# Altium integrated library esd_library.IntLib: 968 symbols (part 1 of 6)
Pins are listed as number, name and electrical type; pins without a type are passive.

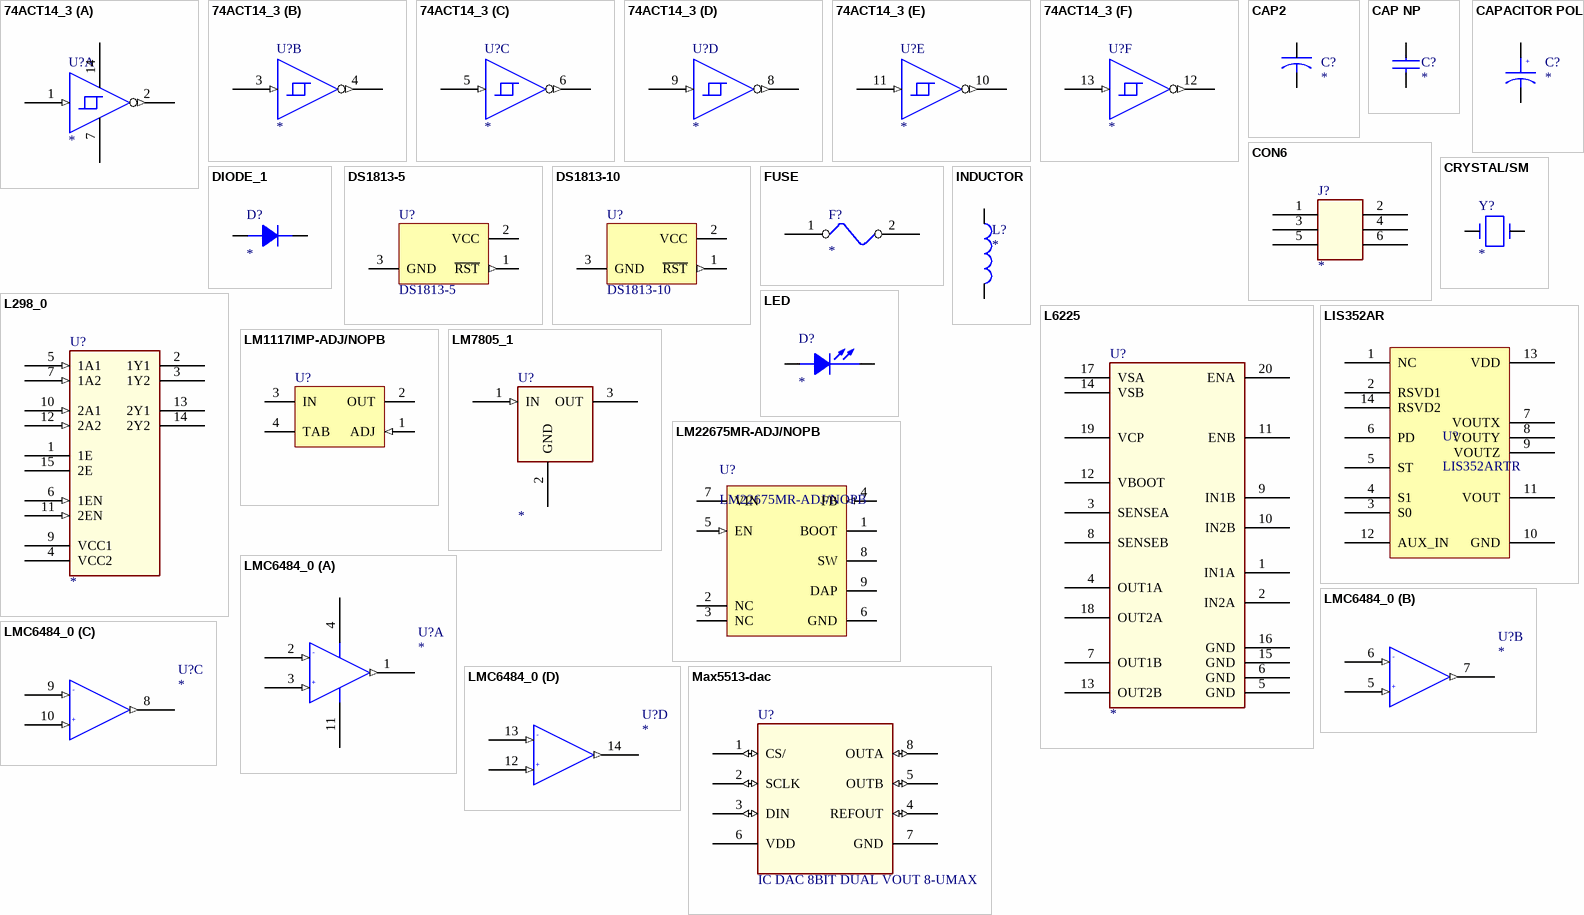
[diagram p0: symbols 74ACT14_3 to Max5513-dac]

## 74ACT14_3
designator U?
IC INVERTER HEX SCHMITT 14SOIC; MPN: 74ACT14SCX; PN: 74ACT14SCXCT-ND; URL: http://www.digikey.ca/product-detail/en/74ACT14SCX/74ACT14SCXCT-ND
footprint SOIC127P600X175-14M (SOIC, 14-Leads, Body 8.65x3.90mm, Pitch 1.27mm, IPC Low Density)
part A pins: 1 A (in), 2 Y (out), 7 GND_POWER (power), 14 VCC (power)
part B pins: 3 A (in), 4 Y (out)
part C pins: 5 A (in), 6 Y (out)
part D pins: 8 Y (out), 9 A (in)
part E pins: 10 Y (out), 11 A (in)
part F pins: 12 Y (out), 13 A (in)

## CAP2
designator C?
pins: 1, 2

## CAP NP
designator C?
pins: 1, 2

## CAPACITOR POL
designator C?
pins: 1, 2
text: +

## CON6
designator J?
CONN HEADER BRKWAY 6POS DL .100; MPN: 5-146254-3; PN: A105155-ND; URL: http://www.digikey.ca/product-detail/en/5-146254-3/A105155-ND
footprint HDR3X2 (Connector; Header Male; 3x2 Position)
pins: 1, 2, 3, 4, 5, 6

## CRYSTAL/SM
designator Y?
pins: 1, 2

## DIODE_1
designator D?
pins: 1 A, 2 C

## DS1813-5
designator U?
5V EconoReset with Pushbutton; MPN: DS1813R-5+T&R; PN: DS1813R-5+CT-ND; Published: 13-Oct-2000; LatestRevisionDate: 17-Jul-2002; LatestRevisionNote: Re-released for DXP Platform.; DatasheetVersion: 7-May-1998; PackageVersion: Feb-1999; PackageReference: TO-92; Publisher: Altium Limited; PackageDescription: TO, Flat Index; 3 In-Line, Axial Leads; Body Dia. 4.7mm; Leads 0.56 x 0.51 mm (max); ComponentLink1Description: Manufacturer Link; ComponentLink1URL: http://www.maxim-ic.com/; ComponentLink2Description: Datasheet; ComponentLink2URL: http://pdfserv.maxim-ic.com/en/ds/DS1813.pdf; URL: http://www.digikey.ca/product-detail/en/DS1813R-5%2BT%26R/DS1813R-5%2BCT-ND
footprint SOT95P230X110-3M (SOT23, 3-Leads, Body 2.90x2.30mm, Pitch 0.95mm, IPC Low Density)
pins: 1 ~{RST} (out), 2 VCC (power), 3 GND (power)

## DS1813-10
designator U?
5V EconoReset with Pushbutton; MPN: DS1813R-10+T&R; PN: DS1813R-10+T&RCT-ND; Published: 13-Oct-2000; LatestRevisionDate: 17-Jul-2002; LatestRevisionNote: Re-released for DXP Platform.; DatasheetVersion: 7-May-1998; PackageVersion: Feb-1999; PackageReference: TO-92; Publisher: Altium Limited; PackageDescription: TO, Flat Index; 3 In-Line, Axial Leads; Body Dia. 4.7mm; Leads 0.56 x 0.51 mm (max); ComponentLink1Description: Manufacturer Link; ComponentLink1URL: http://www.maxim-ic.com/; ComponentLink2Description: Datasheet; ComponentLink2URL: http://pdfserv.maxim-ic.com/en/ds/DS1813.pdf; URL: http://www.digikey.ca/product-detail/en/DS1813R-10%2BT%26R/DS1813R-10%2BT%26RCT-ND
footprint SOT95P230X110-3M (SOT23, 3-Leads, Body 2.90x2.30mm, Pitch 0.95mm, IPC Low Density)
pins: 1 ~{RST} (out), 2 VCC (power), 3 GND (power)

## FUSE
designator F?
pins: 1, 2

## INDUCTOR
designator L?
pins: 1, 2

## L298_0
designator U?
IC BRIDGE DRIVER PAR 15MULTIWATT; MPN: L298N; PN: 497-1395-5-ND; URL: http://www.digikey.ca/product-detail/en/L298N/497-1395-5-ND
footprint ZIGZAG.100/L.850/15_VERT
pins: 1 1E, 2 1Y1 (hiz), 3 1Y2 (hiz), 4 VCC2 (power), 5 1A1 (in), 6 1EN (in), 7 1A2 (in), 8 GND_POWER (power) hidden to GND_POWER, 9 VCC1 (power), 10 2A1 (in), 11 2EN (in), 12 2A2 (in), 13 2Y1 (hiz), 14 2Y2 (hiz), 15 2E

## L6225
designator U?
IC MOTOR DRIVER PAR 20POWERSO; MPN: L6225PDTR; PN: 497-5345-1-ND; URL: http://www.digikey.ca/product-detail/en/L6225PDTR/497-5345-1-ND
footprint POWERSOP20
pins: 1 IN1A, 2 IN2A, 3 SENSEA (oc), 4 OUT1A, 5 GND (power), 6 GND (power), 7 OUT1B, 8 SENSEB (power), 9 IN1B, 10 IN2B, 11 ENB, 12 VBOOT (power), 13 OUT2B, 14 VSB (power), 15 GND (power), 16 GND (power), 17 VSA (power), 18 OUT2A, 19 VCP (power), 20 ENA

## LED
designator D?
pins: 1 A, 2 C

## LIS352AR
designator U?, comment LIS352ARTR
IC ACCELEROMETER 3AXIS LP 14LGA; PN: 497-11075-1-ND; MPN: LIS352ARTR; URL: http://www.digikey.ca/product-detail/en/LIS352ARTR/497-11075-1-ND
footprint LGA-14-3X5MM
pins: 1 NC "Internally not connected", 2 RSVD1 "Connect to Vdd", 3 S0 "Mux selector 0 (connect to Vdd or to GND)", 4 S1 "Mux selector 1 (connect to Vdd or to GND)", 5 ST "Self-test (logic 0: normal mode; logic 1: self-test)", 6 PD "Power-down (logic 0: normal mode; logic 1: power-down mode)", 7 VOUTX "Output voltage X channel", 8 VOUTY "Output voltage Y channel", 9 VOUTZ "Output voltage Z channel", 10 GND "0 V supply", 11 VOUT "Multiplexer output", 12 AUX_IN "Auxiliary input", 13 VDD "Power supply", 14 RSVD2 "Connect to Vdd"

## LM1117IMP-ADJ/NOPB
designator U?
800mA Low-Dropout Linear Regulator, 4-pin SOT-223, Pb-Free; PartNumber: LM1117IMP-ADJ/NOPB; Manufacturer: National Semiconductor; MPN: LM1117MP-3.3/NOPB; PackageTopMarking: XYTT*N03B; PowerWise: N; CompType: LDO IC; PN: LM1117MP-3.3/NOPBCT-ND; Published: 1-Mar-2010; DatasheetVersion: Apr-2006; PackageVersion: revB, Apr-2003; PackageReference: MP04A; Publisher: Altium Limited; PackageDescription: Molded SOT-223, 6.50 x 3.56 x 1.6mm Body, 4 Lead, 2.3mm Pitch; Supplier 1: Digi-Key; Supplier Part Number 1: LM1117IMP-ADJTR-ND; Supplier 2: Digi-Key; Supplier Part Number 2: LM1117IMP-ADJCT-ND; Supplier 3: Digi-Key; Supplier Part Number 3: LM1117IMP-ADJDKR-ND; Supplier 4: Farnell; Supplier Part Number 4: 1469050; RoHS: Y; PinCount: 4; Code_JEDEC: TO-261-AA; Code_IPC: SOT223-4; ComponentLink1Description: LM1117 Datasheet; ComponentLink1URL: http://www.national.com/ds/LM/LM1117.pdf; ComponentLink2Description: LM1117 Web Page; ComponentLink2URL: http://www.national.com/pf/LM/LM1117.html; ComponentLink3Description: MP04A Package Page; ComponentLink3URL: http://www.national.com/packaging/folders/mp04a.html; URL: http://www.digikey.ca/product-detail/en/LM1117MP-3.3%2FNOPB/LM1117MP-3.3%2FNOPBCT-ND
footprint MP04A_L (SOT223, 4-Leads, Body 6.5x3.5mm, Pitch 2.3mm, Lead Span 7mm, IPC High Density)
pins: 1 ADJ (in), 2 OUT (power), 3 IN (power), 4 TAB (power)

## LM7805_1
designator U?
IC REG LDO 5V 1A TO220-3; MPN: LM7805CT; PN: LM7805CT-ND; URL: http://www.digikey.ca/product-detail/en/LM7805CT/LM7805CT-ND
footprint TO220
pins: 1 IN (in), 2 GND, 3 OUT (power)

## LM22675MR-ADJ/NOPB
designator U?
1A SIMPLE SWITCHER®, Step-Down Voltage Regulator with Precision Enable, 8-pin PSOP, Pb-Free; Manufacturer: National Semiconductor; MPN: LM22675MRE-ADJ/NOPB; PackageTopMarking: NSXYTT*L22675*ADJ; PowerWise: N; High-Reliability: Y; PN: LM22675MRE-ADJ/NOPBCT-ND; DatasheetVersion: Dec-2010; PackageVersion: revB, Dec-2007; PackageReference: MRA08B; PackageDescription: Molded, PSOP .193 x .154 x .058in, 8 Lead, .050in Pitch, Large DAP; PartNumber: LM22675MR-ADJ/NOPB; RoHS: Y; PinCount: 8; CompType: Switcher; Code_JEDEC: MS-012-AA; ComponentLink1Description: Manufacturer URL; ComponentLink1URL: http://www.national.com/; ComponentLink2Description: LM22675 Datasheet; ComponentLink2URL: http://www.national.com/ds/LM/LM22675.pdf; ComponentLink3Description: LM22675 Web Page; ComponentLink3URL: http://www.national.com/pf/LM/LM22675.html; ComponentLink4Description: MRA08B Package Page; ComponentLink4URL: http://www.national.com/packaging/folders/mra08b.html; URL: http://www.digikey.ca/product-detail/en/LM22675MRE-ADJ%2FNOPB/LM22675MRE-ADJ%2FNOPBCT-ND
footprint MRA08B_N (SOIC, 8-Leads, Body 4.9x3.9mm, Pitch 1.27mm, Thermal Pad, IPC Medium Density)
footprint MRA08B_L (SOIC, 8-Leads, Body 4.9x3.9mm, Pitch 1.27mm, Exposed Pad, IPC High Density)
footprint MRA08B_M (SOIC, 8-Leads, Body 4.9x3.9mm, Pitch 1.27mm, Thermal Pad, IPC Low Density)
pins: 1 BOOT, 2 NC, 3 NC, 4 FB (in), 5 EN (in), 6 GND (power), 7 VIN (power), 8 SW (power), 9 DAP (power)

## LMC6484_0
designator U?
IC OPAMP GP 1.5MHZ RRO 14SOIC; MPN: LMC6484IMX/NOPB; PN: LMC6484IMX/NOPBCT-ND; URL: http://www.digikey.ca/product-detail/en/LMC6484IMX%2FNOPB/LMC6484IMX%2FNOPBCT-ND
footprint SOIC127P600X175-14M-NS (SOIC, 14-Leads, Body 8.62x3.90mm, Pitch 1.27mm, IPC Low Density)
part A pins: 1 OUT1 (out), 2 INVIN 1 (in), 3 NINVIN 1 (in), 4 VCC (power), 11 -VCC (power)
part B pins: 5 NINVIN2 (in), 6 INVIN2 (in), 7 OUT2 (out)
part C pins: 8 OUT3 (out), 9 INVIN3 (in), 10 NINVIN3 (in)
part D pins: 12 NINVIN4 (in), 13 INVIN4 (in), 14 OUT4 (out)
part A text: -; +
part B text: -; +
part C text: -; +
part D text: -; +

## Max5513-dac
designator U?, comment IC DAC 8BIT DUAL VOUT 8-UMAX
MPN: MAX5513EUA+; PN: MAX5513EUA+-ND; URL: http://www.digikey.ca/product-detail/en/MAX5513EUA%2B/MAX5513EUA%2B-ND
footprint TSOP65P490X110-8M (TSOP, 8-Leads, Body 3.00x3.00mm, Pitch 0.65mm, IPC Low Density)
pins: 1 CS/ (io), 2 SCLK (io), 3 DIN (io), 4 REFOUT (io), 5 OUTB (io), 6 VDD (power), 7 GND (power), 8 OUTA (io)

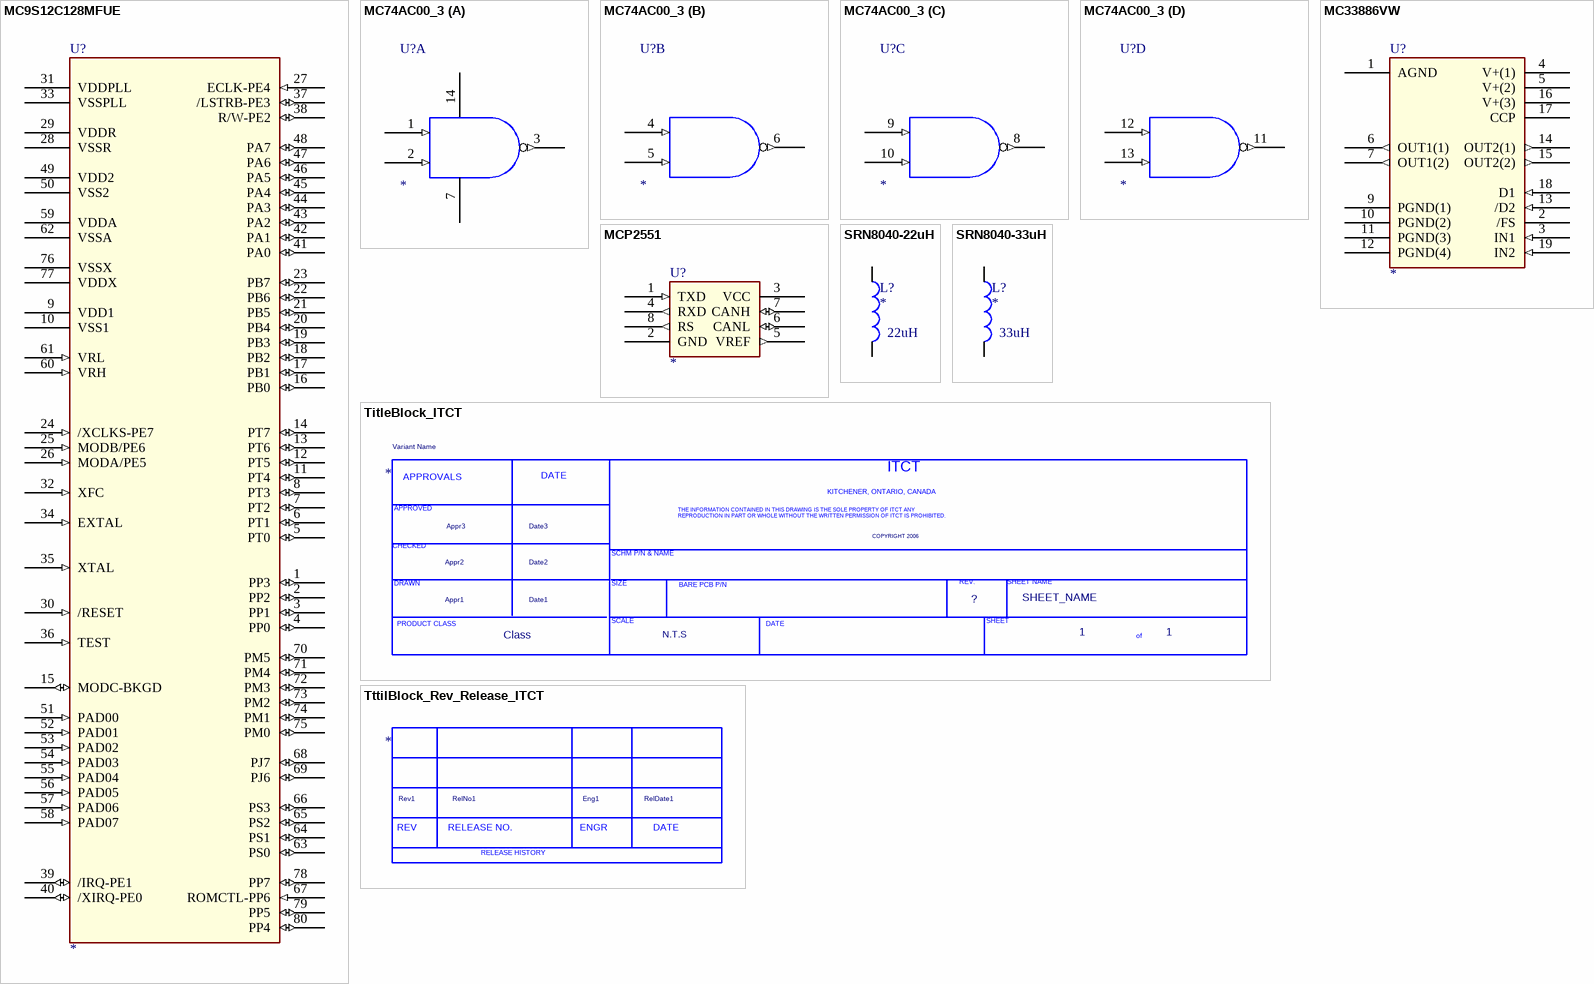
[diagram p1: symbols MC9S12C128MFUE to TttilBlock_Rev_Release_ITCT]

## MC9S12C128MFUE
designator U?
IC MCU 16BIT 128KB FLASH 80QFP; MPN: MC9S12C32CFUE25; PN: MC9S12C32CFUE25-ND; URL: http://www.digikey.ca/product-detail/en/MC9S12C32CFUE25/MC9S12C32CFUE25-ND
footprint QUAD.65M/80/WG17.45-HCS12
pins: 1 PP3 (io), 2 PP2 (io), 3 PP1 (io), 4 PP0 (io), 5 PT0 (io), 6 PT1 (io), 7 PT2 (io), 8 PT3 (io), 9 VDD1 (power), 10 VSS1 (power), 11 PT4 (io), 12 PT5 (io), 13 PT6 (io), 14 PT7 (io), 15 MODC-BKGD (io), 16 PB0 (io), 17 PB1 (io), 18 PB2 (io), 19 PB3 (io), 20 PB4 (io), 21 PB5 (io), 22 PB6 (io), 23 PB7 (io), 24 /XCLKS-PE7 (in), 25 MODB/PE6 (in), 26 MODA/PE5 (in), 27 ECLK-PE4 (in), 28 VSSR (power), 29 VDDR (power), 30 /RESET (in), 31 VDDPLL (power), 32 XFC (in), 33 VSSPLL (power), 34 EXTAL (in), 35 XTAL (in), 36 TEST (in), 37 /LSTRB-PE3 (io), 38 R/W-PE2 (io), 39 /IRQ-PE1 (io), 40 /XIRQ-PE0 (io), 41 PA0 (io), 42 PA1 (io), 43 PA2 (io), 44 PA3 (io), 45 PA4 (io), 46 PA5 (io), 47 PA6 (io), 48 PA7 (io), 49 VDD2 (power), 50 VSS2 (power), 51 PAD00 (in), 52 PAD01 (in), 53 PAD02 (in), 54 PAD03 (in), 55 PAD04 (in), 56 PAD05 (in), 57 PAD06 (in), 58 PAD07 (in), 59 VDDA (power), 60 VRH (in), 61 VRL (in), 62 VSSA (power), 63 PS0 (io), 64 PS1 (io), 65 PS2 (io), 66 PS3 (io), 67 ROMCTL-PP6 (in), 68 PJ7 (io), 69 PJ6 (io), 70 PM5 (io), 71 PM4 (io), 72 PM3 (io), 73 PM2 (io), 74 PM1 (io), 75 PM0 (io), 76 VSSX (power), 77 VDDX (power), 78 PP7 (io), 79 PP5 (io), 80 PP4 (io)

## MC74AC00_3
designator U?
IC GATE NAND 4CH 2-INP 14-SOIC; MPN: MC74AC00DR2G; PN: MC74AC00DR2GOSCT-ND; URL: http://www.digikey.com/product-detail/en/MC74AC00DR2G/MC74AC00DR2GOSCT-ND
footprint SOIC127P600X175-14M (SOIC, 14-Leads, Body 8.65x3.90mm, Pitch 1.27mm, IPC Low Density)
part A pins: 1 I0 (in), 2 I1 (in), 3 O (out), 7 (power), 14 VCC (power)
part B pins: 4 I0 (in), 5 I1 (in), 6 O (out)
part C pins: 8 O (out), 9 I0 (in), 10 I1 (in)
part D pins: 11 O (out), 12 I0 (in), 13 I1 (in)
1 alternate drawing of the same symbol

## MC33886VW
designator U?
IC MOTOR DRIVER PAR 20HSOP; MPN: MC33886PVW; PN: MC33886PVW-ND; URL: http://www.digikey.ca/product-detail/en/MC33886PVW/MC33886PVW-ND
footprint POWERSOP20
pins: 1 AGND (power), 2 /FS (oc), 3 IN1 (in), 4 V+(1) (power), 5 V+(2) (power), 6 OUT1(1) (out), 7 OUT1(2) (out), 9 PGND(1) (power), 10 PGND(2) (power), 11 PGND(3) (power), 12 PGND(4) (power), 13 /D2 (in), 14 OUT2(1) (out), 15 OUT2(2) (out), 16 V+(3) (power), 17 CCP, 18 D1 (in), 19 IN2 (in)

## MCP2551
designator U?
IC TRANSCEIVER CAN HI-SPD 8-SOIC; MPN: MCP2551T-E/SN; PN: MCP2551T-E/SNCT-ND; URL: http://www.digikey.com/product-detail/en/MCP2551T-E%2FSN/MCP2551T-E%2FSNCT-ND
footprint SOIC127P600X175-8M (SOIC, 8-Leads, Body 4.90x3.90mm, Pitch 1.27mm, IPC Low Density)
pins: 1 TXD (in), 2 GND (power), 3 VCC (power), 4 RXD (out), 5 VREF (out), 6 CANL (io), 7 CANH (io), 8 RS (out)

## SRN8040-22uH
designator L?  value 22uH
FIXED IND 22UH 2.2A 100 MOHM SMD; MPN: SRN8040-220M; PN: SRN8040-220MCT-ND; URL: http://www.digikey.ca/product-detail/en/SRN8040-220M/SRN8040-220MCT-ND
footprint INDP8080X40M (Precision Wire Wound Inductor, 2-Leads, Body 8.00x8.00mm, IPC Low Density)
pins: 1, 2

## SRN8040-33uH
designator L?  value 33uH
FIXED IND 33UH 2.2A 100 MOHM SMD; MPN: SRN8040-330M; PN: SRN8040-330MCT-ND; URL: http://www.digikey.ca/product-detail/en/SRN8040-330M/SRN8040-330MCT-ND
footprint INDP8080X40M (Precision Wire Wound Inductor, 2-Leads, Body 8.00x8.00mm, IPC Low Density)
pins: 1, 2

## TitleBlock_ITCT
designator *  scale: N.T.S  Page Number: 1  Copyright: COPYRIGHT 2006  (graphical)
Cage Code: cage code; Variant Name: Variant Name; SHEET_NAME: SHEET_NAME; RevCode: ?; Page Count: 1; Class: Class; Date1: Date1; Date2: Date2; Date3: Date3; Appr1: Appr1; Appr2: Appr2; Appr3: Appr3
text: ITCT; APPROVALS; DATE; KITCHENER, ONTARIO, CANADA; THE INFORMATION CONTAINED IN THIS DRAWING IS THE SOLE PROPERTY OF ITCT ANY / REPRODUCTION IN PART OR WHOLE WITHOUT THE WRITTEN PERMISSION OF ITCT IS PROHIBITED.; APPROVED; CHECKED; SCHM P/N & NAME; DRAWN; SIZE; BARE PCB P/N; REV.; SHEET NAME; SCALE; SHEET; PRODUCT CLASS; of

## TttilBlock_Rev_Release_ITCT
designator *  (graphical)
Page Count: 1; Page Number: 1; RevCode: ?; RelDate1: RelDate1; Eng1: Eng1; RelNo1: RelNo1; Rev1: Rev1
text: REV; RELEASE NO.; ENGR; DATE; RELEASE HISTORY


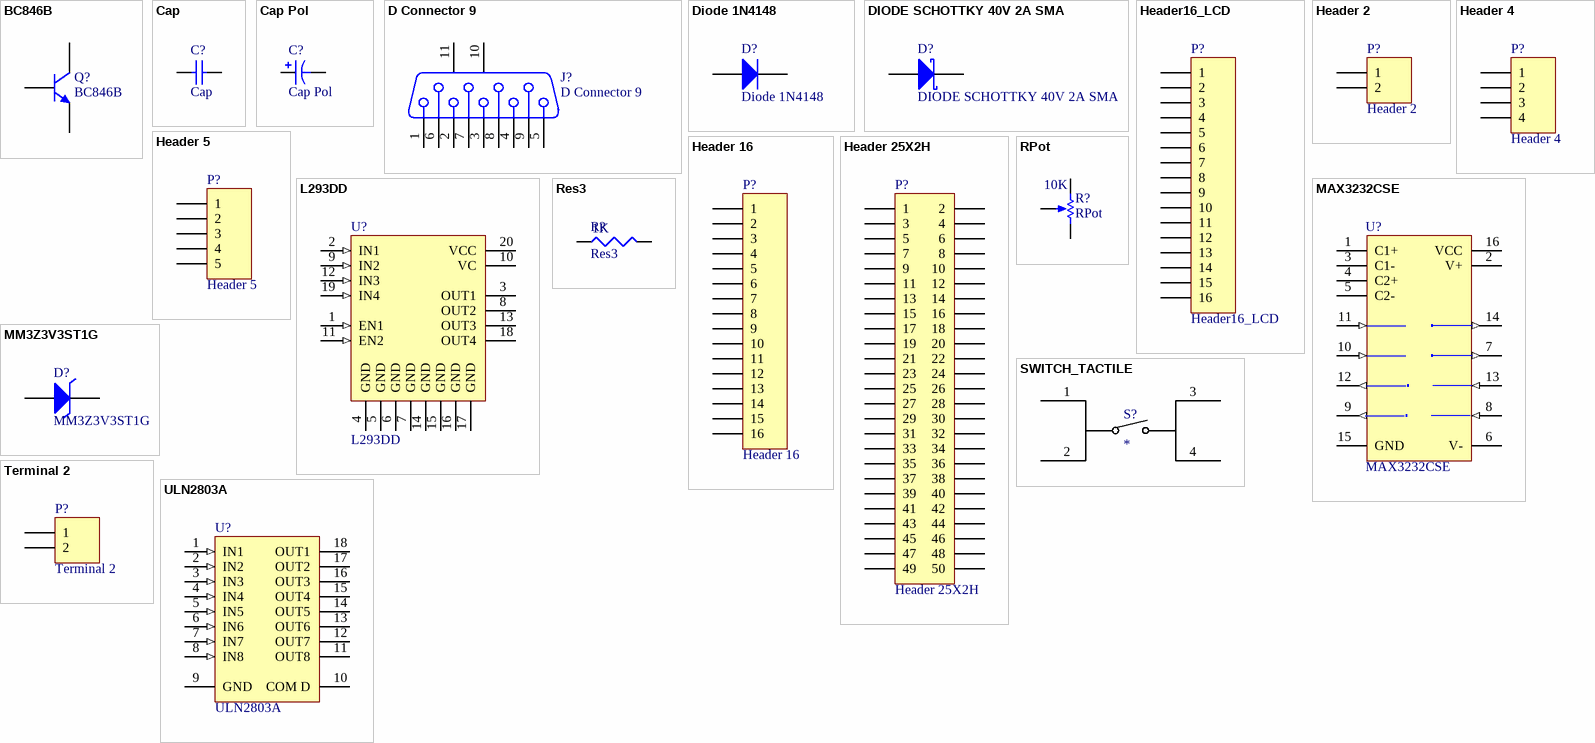
[diagram p2: symbols BC846B to ULN2803A]

## BC846B
designator Q?
NPN General Purpose Amplifier; PN: 568-1632-1-ND; URL: http://www.digikey.ca/product-detail/en/BC846B,215/568-1632-1-ND/763459
footprint SOT95P230X110-3M (SOT23, 3-Leads, Body 2.90x2.30mm, Pitch 0.95mm, IPC Low Density)
pins: 1 B, 2 E, 3 C

## Cap
designator C?
Capacitor
footprint CAPC2012X09M (Chip Capacitor, 2-Leads, Body 2.00x1.25mm, IPC Low Density)
pins: 1, 2

## Cap Pol
designator C?
Polarized Capacitor
pins: 1, 2
1 alternate drawing of the same symbol

## D Connector 9
designator J?
Receptacle Assembly, 9 Position, Right Angle; MPN: ADF09A-KG-TASB3-R; PN: AE10921-ND; URL: http://www.digikey.ca/product-detail/en/ADF09A-KG-TASB3-R/AE10921-ND
footprint DSUB1.385-2H9 (Connector; D Subminiature; 9 Position; Right Angle; Pitch 1.385 mm)
signal-integrity model Connector
pins: 1, 2, 3, 4, 5, 6, 7, 8, 9, 10 MH1, 11 MH2

## Diode 1N4148
designator D?
High Conductance Fast Diode; MPN: 1N4148WX-TP; PN: 1N4148WXTPMSCT-ND; URL: http://www.digikey.ca/product-detail/en/1N4148WX-TP/1N4148WXTPMSCT-ND
signal-integrity model 1N4148
footprint zener_sod323
pins: A, K

## DIODE SCHOTTKY 40V 2A SMA
designator D?
Schottky Rectifier; MPN: B240A-13-F; PN: B240A-FDICT-ND; URL: http://www.digikey.ca/product-detail/en/B240A-13-F/B240A-FDICT-ND
footprint DIOM4326X23M (Molded Diode, 2-Leads, Body 4.30x2.60mm, IPC Low Density)
pins: 1 K, 2 A

## Header16_LCD
designator P?
Header, 16-Pin Female; MPN: PPPC161LFBN-RC; PN: S7049-ND; URL: http://www.digikey.ca/product-detail/en/PPPC161LFBN-RC/S7049-ND
signal-integrity model Connector
footprint HDR1X16_LCD (Connector; Header; 16 Position, For LCD)
pins: 1, 2, 3, 4, 5, 6, 7, 8, 9, 10, 11, 12, 13, 14, 15, 16

## Header 2
designator P?
Header, 2-Pin; MPN: PEC02SFAN; PN: S1212E-02-ND; URL: http://www.digikey.ca/product-detail/en/PEC04SFAN/S1212E-02-ND
footprint HDR1X2 (Connector; Header; 2 Position)
signal-integrity model Connector
pins: 1, 2

## Header 4
designator P?
Header, 4-Pin; MPN: PEC04SFAN; PN: S1212E-04-ND; URL: http://www.digikey.ca/product-detail/en/PEC04SFAN/S1212E-04-ND
footprint HDR1X4 (Connector; Header; 4 Position)
signal-integrity model Connector
pins: 1, 2, 3, 4

## Header 5
designator P?
Header, 5-Pin; MPN: PEC05SFAN; PN: S1212E-05-ND; URL: http://www.digikey.ca/product-detail/en/PEC05SFAN/S1212E-05-ND/859446
footprint HDR1X5 (Connector; Header; 5 Position)
signal-integrity model Connector
pins: 1, 2, 3, 4, 5

## Header 16
designator P?
Header, 16-Pin Female; MPN: PPPC161LFBN-RC; PN: S7049-ND; URL: http://www.digikey.ca/product-detail/en/PPPC161LFBN-RC/S7049-ND
footprint HDR1X16 (Connector; Header; 16 Position)
signal-integrity model Connector
pins: 1, 2, 3, 4, 5, 6, 7, 8, 9, 10, 11, 12, 13, 14, 15, 16

## Header 25X2H
designator P?
Header, 25-Pin, Dual row, female; MPN: PPPC252LFBN-RC; PN: S7128-ND; URL: http://www.digikey.ca/product-detail/en/PPPC252LFBN-RC/S7128-ND
signal-integrity model Connector
footprint PPPC252LFBN-RC (Connector; Header; 25x2 Position, Large pads)
pins: 1, 2, 3, 4, 5, 6, 7, 8, 9, 10, 11, 12, 13, 14, 15, 16, 17, 18, 19, 20, 21, 22, 23, 24, 25, 26, 27, 28, 29, 30, 31, 32, 33, 34, 35, 36, 37, 38, 39, 40, 41, 42, 43, 44, 45, 46, 47, 48, 49, 50

## L293DD
designator U?
Push-Pull Four Channel Driver With Diode; PN: 497-2937-1-ND; Published: 8-Jun-2000; LatestRevisionDate: 13-Apr-2006; LatestRevisionNote: IPC-7351 Footprint Added.; DatasheetVersion: Jun-1996; PackageVersion: Jul-2001; PackageReference: SO20; Publisher: Altium Limited; PackageDescription: 20-Pin Plastic Small Outline Integrated Circuit 1.27 mm Pitch; Code_JEDEC: MS-013-AC; Code_IPC: SOIC127P1030-20; ComponentLink1Description: Manufacturer Link; ComponentLink1URL: http://www.st.com/; ComponentLink2Description: Datasheet; ComponentLink2URL: http://www.st.com/stonline/products/literature/ds/1330/l293d.pdf; URL: http://www.digikey.ca/product-detail/en/L293DD013TR/497-2937-1-ND/634902
footprint SO20_N (SOIC, 20-Leads, Body 12.8x7.5mm, Pitch 1.27mm, IPC Medium Density)
footprint SO20_L (SOIC, 20-Leads, Body 12.8x7.5mm, Pitch 1.27mm, IPC High Density)
footprint SO20_M (SOIC, 20-Leads, Body 12.8x7.5mm, Pitch 1.27mm, IPC Low Density)
3D model SO20 (PCB3D Model)
pins: 1 EN1 (in), 2 IN1 (in), 3 OUT1 (hiz), 4 GND (power), 5 GND (power), 6 GND (power), 7 GND (power), 8 OUT2 (hiz), 9 IN2 (in), 10 VC (power), 11 EN2 (in), 12 IN3 (in), 13 OUT3 (hiz), 14 GND (power), 15 GND (power), 16 GND (power), 17 GND (power), 18 OUT4 (hiz), 19 IN4 (in), 20 VCC (power)

## MAX3232CSE
designator U?
3.0V TO 5.5V, Low-Power, up to 1Mbps, True RS-232 Transceiver Using Four 0.1µF External Capacitor; MPN: MAX3232CSE+; PN: MAX3232CSE+-ND; Published: 16-Jan-2001; LatestRevisionDate: 13-Apr-2006; LatestRevisionNote: IPC-7351 Footprint Added.; DatasheetVersion: Mar-1999; PackageReference: NSO16; Publisher: Altium Limited; PackageDescription: 16-Pin Small Outline Integrated Circuit 1.27 mm Pitch; Code_JEDEC: MS-012-AC; Code_IPC: SOIC127P600-16; ComponentLink1Description: Manufacturer Link; ComponentLink1URL: http://www.maxim-ic.com/; ComponentLink2Description: Datasheet; ComponentLink2URL: http://pdfserv.maxim-ic.com/en/ds/MAX3222-MAX3241.pdf; URL: http://www.digikey.ca/product-detail/en/MAX3232CSE%2B/MAX3232CSE%2B-ND
footprint NSO16_N (SOIC, 16-Leads, Body 9.9x3.9mm, Pitch 1.27mm, IPC Medium Density)
footprint NSO16_L (SOIC, 16-Leads, Body 9.9x3.9mm, Pitch 1.27mm, IPC High Density)
footprint NSO16_M (SOIC, 16-Leads, Body 9.9x3.9mm, Pitch 1.27mm, IPC Low Density)
3D model NSO16 (PCB3D Model)
pins: 1 C1+, 2 V+ (power), 3 C1-, 4 C2+, 5 C2-, 6 V- (power), 7 T2OUT (out), 8 R2IN (in), 9 R2OUT (out), 10 T2IN (in), 11 T1IN (in), 12 R1OUT (out), 13 R1IN (in), 14 T1OUT (out), 15 GND (power), 16 VCC (power)

## MM3Z3V3ST1G
designator D?
3.3V, 200mw Zener; PN: MM3Z3V3ST1GOSCT-ND; URL: http://www.digikey.ca/product-detail/en/MM3Z3V3ST1G/MM3Z3V3ST1GOSCT-ND/2705113
signal-integrity model Diode
footprint zener_sod323
pins: A, K

## Res3
designator R?  value 1K
Resistor
footprint RESC2112X05M (Chip Resistor, 2-Leads, Body 2.05x1.25mm, IPC Low Density)
pins: 1, 2

## RPot
designator R?  value 10K
Potentiometer; Sim Note: Enter the Resistance value and the set point into parameter fields.; Set Position: 0.5; PN: 3352T-103LF-ND; Published: 8-Jun-2000; LatestRevisionDate: 17-Jul-2002; LatestRevisionNote: Re-released for DXP Platform.; PackageReference: VR5; Publisher: Altium Limited; PackageDescription: Variable Resistor, Thru-Hole; 3 Leads; URL: http://www.digikey.ca/product-detail/en/3352T-1-103LF/3352T-103LF-ND/1088341
footprint BOURNS_3386F (Top Adjust Trimpot)
pins: 1 TOP, 2 TAP, 3 BOT
1 alternate drawing of the same symbol

## SWITCH_TACTILE
designator S?
SWITCH TACTILE SPST-NO 0.05A 12V; MPN: PTS645SH50SMTR92 LFS; PN: CKN9085CT-ND; URL: http://www.digikey.ca/product-detail/en/PTS645SH50SMTR92%20LFS/CKN9085CT-ND
footprint TACT_SWITCH_6MM_SMT
pins: 1, 2, 3, 4

## Terminal 2
designator P?
Terminal, 2-Pin; PN: A98342-ND; LatestRevisionDate: 17-Jul-2002; LatestRevisionNote: Re-released for DXP Platform.; Publisher: Altium Limited; URL: http://www.digikey.ca/product-detail/en/282841-2/A98342-ND/1136740
signal-integrity model Connector
footprint TYCO_282841_2
pins: 1, 2

## ULN2803A
designator U?
Eight Darlington Array; PN: ULN2803AFWGCELCT-ND; Published: 8-Jun-2000; LatestRevisionDate: 06-Jun-2005; LatestRevisionNote: Stylized 3D Model Added.; DatasheetVersion: Sep-1997; PackageReference: DIP18; Publisher: Altium Limited; PackageDescription: DIP; 18 Leads; Row Spacing 7.62 mm; Pitch 2.54 mm; ComponentLink1Description: Manufacturer Link; ComponentLink1URL: http://www.st.com/; ComponentLink2Description: Datasheet; ComponentLink2URL: http://www.st.com/stonline/products/literature/ds/1536/uln2801a.pdf; URL: http://www.digikey.ca/product-detail/en/ULN2803AFWG,C,EL/ULN2803AFWGCELCT-ND/2183710
footprint SOIC127P1030X260-18M (SOIC, 18-Leads, Body 11.51x7.50mm, Pitch 1.27mm, IPC Low Density)
pins: 1 IN1 (in), 2 IN2 (in), 3 IN3 (in), 4 IN4 (in), 5 IN5 (in), 6 IN6 (in), 7 IN7 (in), 8 IN8 (in), 9 GND (power), 10 COM D, 11 OUT8 (oc), 12 OUT7 (oc), 13 OUT6 (oc), 14 OUT5 (oc), 15 OUT4 (oc), 16 OUT3 (oc), 17 OUT2 (oc), 18 OUT1 (oc)


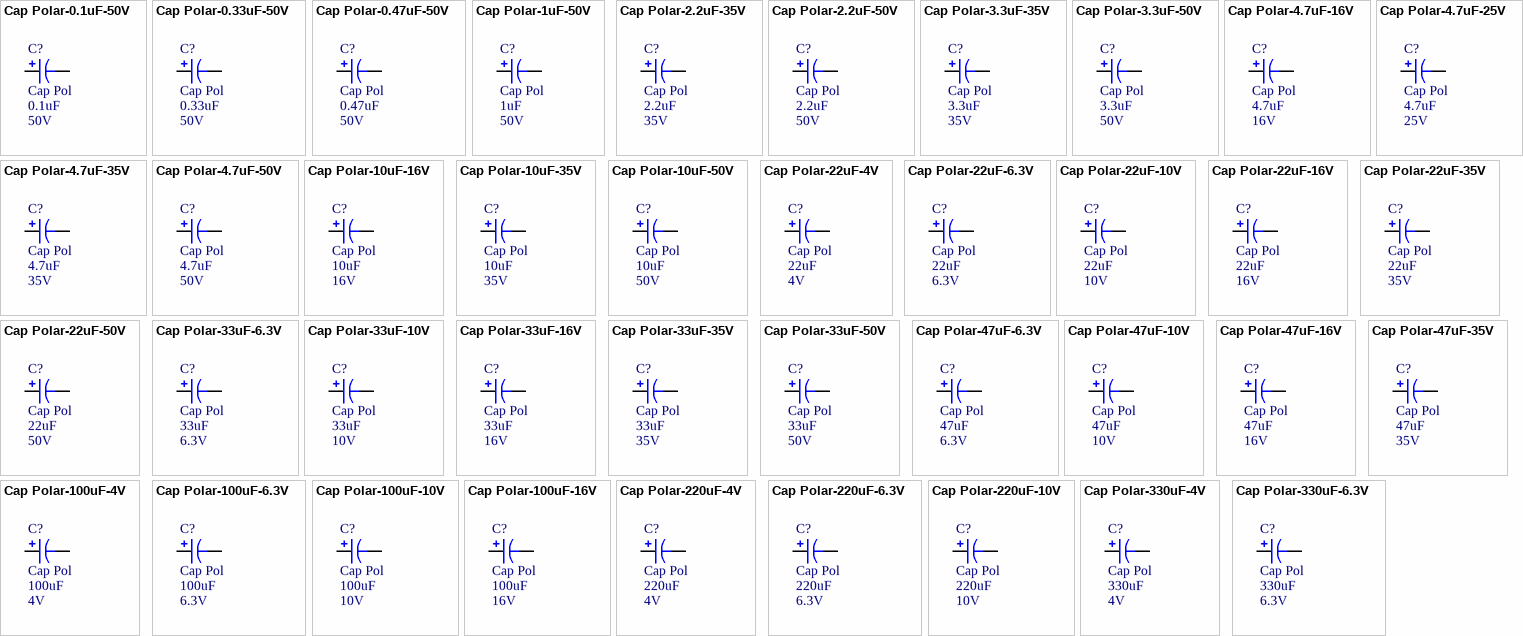
[diagram p3: symbols Cap Polar-0.1uF-50V to Cap Polar-330uF-6.3V]

## Cap Polar-0.1uF-50V
designator C?, comment Cap Pol  value 0.1uF  Voltage: 50V
CAP 85C 0.1uF ±20% 50V WX Series Aluminum Electrolytic; MPN: UWX1H0R1MCL2GB; Name: Cap Polar-0.1uF-50V; Tan Theta: 0.12; Leakage Current: 3; Rated Ripple Current: 1; PN: 493-2121-1-ND; Diameter: 3; URL: http://www.digikey.ca/product-detail/en/UWX1H0R1MCL2GB/493-2121-1-ND
footprint CAPACITOR_3MM
pins: 1, 2
1 alternate drawing of the same symbol

## Cap Polar-0.33uF-50V
designator C?, comment Cap Pol  value 0.33uF  Voltage: 50V
CAP 85C 0.33uF ±20% 50V WX Series Aluminum Electrolytic; MPN: UWX1HR33MCL2GB; Name: Cap Polar-0.33uF-50V; Tan Theta: 0.12; Leakage Current: 3; Rated Ripple Current: 2.8; PN: 493-2125-1-ND; Diameter: 3; URL: http://www.digikey.ca/product-detail/en/UWX1HR33MCL2GB/493-2125-1-ND
footprint CAPACITOR_3MM
pins: 1, 2
1 alternate drawing of the same symbol

## Cap Polar-0.47uF-50V
designator C?, comment Cap Pol  value 0.47uF  Voltage: 50V
CAP 85C 0.47uF ±20% 50V WX Series Aluminum Electrolytic; MPN: UWX1HR47MCL2GB; Name: Cap Polar-0.47uF-50V; Tan Theta: 0.12; Leakage Current: 3; Rated Ripple Current: 4; PN: 493-2127-1-ND; Diameter: 3; URL: http://www.digikey.ca/product-detail/en/UWX1HR47MCL2GB/493-2127-1-ND
footprint CAPACITOR_3MM
pins: 1, 2
1 alternate drawing of the same symbol

## Cap Polar-1uF-50V
designator C?, comment Cap Pol  value 1uF  Voltage: 50V
CAP 85C 1uF ±20% 50V WX Series Aluminum Electrolytic; MPN: UWX1H010MCL2GB; Name: Cap Polar-1uF-50V; Tan Theta: 0.12; Leakage Current: 3; Rated Ripple Current: 8; PN: 493-2129-1-ND; Diameter: 3; URL: http://www.digikey.ca/product-detail/en/UWX1H010MCL2GB/493-2129-1-ND
footprint CAPACITOR_3MM
pins: 1, 2
1 alternate drawing of the same symbol

## Cap Polar-2.2uF-35V
designator C?, comment Cap Pol  value 2.2uF  Voltage: 35V
CAP 85C 2.2uF ±20% 35V WX Series Aluminum Electrolytic; MPN: UWX1V2R2MCL2GB; Name: Cap Polar-2.2uF-35V; Tan Theta: 0.12; Leakage Current: 3; Rated Ripple Current: 8.4; PN: 493-2114-1-ND; Diameter: 3; URL: http://www.digikey.ca/product-detail/en/UWX1V2R2MCL2GB/493-2114-1-ND
footprint CAPACITOR_3MM
pins: 1, 2
1 alternate drawing of the same symbol

## Cap Polar-2.2uF-50V
designator C?, comment Cap Pol  value 2.2uF  Voltage: 50V
CAP 85C 2.2uF ±20% 50V WX Series Aluminum Electrolytic; MPN: UWX1H2R2MCL2GB; Name: Cap Polar-2.2uF-50V; Tan Theta: 0.12; Leakage Current: 3; Rated Ripple Current: 10; PN: 493-2131-1-ND; Diameter: 3; URL: http://www.digikey.ca/product-detail/en/UWX1H2R2MCL2GB/493-2131-1-ND
footprint CAPACITOR_3MM
pins: 1, 2
1 alternate drawing of the same symbol

## Cap Polar-3.3uF-35V
designator C?, comment Cap Pol  value 3.3uF  Voltage: 35V
CAP 85C 3.3uF ±20% 35V WX Series Aluminum Electrolytic; MPN: UWX1V3R3MCL2GB; Name: Cap Polar-3.3uF-35V; Tan Theta: 0.12; Leakage Current: 3; Rated Ripple Current: 10; PN: 493-2115-1-ND; Diameter: 3; URL: http://www.digikey.ca/product-detail/en/UWX1V3R3MCL2GB/493-2115-1-ND
footprint CAPACITOR_3MM
pins: 1, 2
1 alternate drawing of the same symbol

## Cap Polar-3.3uF-50V
designator C?, comment Cap Pol  value 3.3uF  Voltage: 50V
CAP 85C 3.3uF ±20% 50V WX Series Aluminum Electrolytic; MPN: UWX1H3R3MCL1GB; Name: Cap Polar-3.3uF-50V; Tan Theta: 0.12; Leakage Current: 3; Rated Ripple Current: 17; PN: 493-2133-1-ND; Diameter: 4; URL: http://www.digikey.ca/product-detail/en/UWX1H3R3MCL1GB/493-2133-1-ND
footprint CAPACITOR_4MM
pins: 1, 2
1 alternate drawing of the same symbol

## Cap Polar-4.7uF-16V
designator C?, comment Cap Pol  value 4.7uF  Voltage: 16V
CAP 85C 4.7uF ±20% 16V WX Series Aluminum Electrolytic; MPN: UWX1E4R7MCL1GB; Name: Cap Polar-4.7uF-16V; Tan Theta: 0.14; Leakage Current: 3; Rated Ripple Current: 16; PN: 493-2107-1-ND; Diameter: 4; URL: http://www.digikey.ca/product-detail/en/UWX1E4R7MCL1GB/493-2107-1-ND
footprint CAPACITOR_4MM
pins: 1, 2
1 alternate drawing of the same symbol

## Cap Polar-4.7uF-25V
designator C?, comment Cap Pol  value 4.7uF  Voltage: 25V
CAP 85C 4.7uF ±20% 25V WX Series Aluminum Electrolytic; MPN: UWX1E4R7MCL2GB; Name: Cap Polar-4.7uF-25V; Tan Theta: 0.14; Leakage Current: 3; Rated Ripple Current: 12; PN: 493-2106-1-ND; Diameter: 3; URL: http://www.digikey.ca/product-detail/en/UWX1E4R7MCL2GB/493-2106-1-ND
footprint CAPACITOR_3MM
pins: 1, 2
1 alternate drawing of the same symbol

## Cap Polar-4.7uF-35V
designator C?, comment Cap Pol  value 4.7uF  Voltage: 35V
CAP 85C 4.7uF ±20% 35V WX Series Aluminum Electrolytic; MPN: UWX1V4R7MCL1GB; Name: Cap Polar-4.7uF-35V; Tan Theta: 0.12; Leakage Current: 3; Rated Ripple Current: 18; PN: 493-2116-1-ND; Diameter: 4; URL: http://www.digikey.ca/product-detail/en/UWX1V4R7MCL1GB/493-2116-1-ND
footprint CAPACITOR_4MM
pins: 1, 2
1 alternate drawing of the same symbol

## Cap Polar-4.7uF-50V
designator C?, comment Cap Pol  value 4.7uF  Voltage: 50V
CAP 85C 4.7uF ±20% 50V WX Series Aluminum Electrolytic; MPN: UWX1H4R7MCL1GB; Name: Cap Polar-4.7uF-50V; Tan Theta: 0.12; Leakage Current: 3; Rated Ripple Current: 20; PN: 493-2134-1-ND; Diameter: 5; URL: http://www.digikey.ca/product-detail/en/UWX1H4R7MCL1GB/493-2134-1-ND
footprint CAPACITOR_5MM
pins: 1, 2
1 alternate drawing of the same symbol

## Cap Polar-10uF-16V
designator C?, comment Cap Pol  value 10uF  Voltage: 16V
CAP 85C 10uF ±20% 16V WX Series Aluminum Electrolytic; MPN: UWX1C100MCL2GB; Name: Cap Polar-10uF-16V; Tan Theta: 0.16; Leakage Current: 3; Rated Ripple Current: 18; PN: 493-2099-1-ND; Diameter: 3; URL: http://www.digikey.ca/product-detail/en/UWX1C100MCL2GB/493-2099-1-ND
footprint CAPACITOR_3MM
pins: 1, 2
1 alternate drawing of the same symbol

## Cap Polar-10uF-35V
designator C?, comment Cap Pol  value 10uF  Voltage: 35V
CAP 85C 10uF ±20% 35V WX Series Aluminum Electrolytic; MPN: UWX1V100MCL1GB; Name: Cap Polar-10uF-35V; Tan Theta: 0.12; Leakage Current: 3.5; Rated Ripple Current: 29; PN: 493-2117-1-ND; Diameter: 5; URL: http://www.digikey.ca/product-detail/en/UWX1V100MCL1GB/493-2117-1-ND
footprint CAPACITOR_5MM
pins: 1, 2
1 alternate drawing of the same symbol

## Cap Polar-10uF-50V
designator C?, comment Cap Pol  value 10uF  Voltage: 50V
CAP 85C 10uF ±20% 50V WX Series Aluminum Electrolytic; MPN: UWX1H100MCL1GB; Name: Cap Polar-10uF-50V; Tan Theta: 0.12; Leakage Current: 5; Rated Ripple Current: 33; PN: 493-2135-1-ND; Diameter: 6.3; URL: http://www.digikey.ca/product-detail/en/UWX1H100MCL1GB/493-2135-1-ND
footprint CAPACITOR_6.3MM
pins: 1, 2
1 alternate drawing of the same symbol

## Cap Polar-22uF-4V
designator C?, comment Cap Pol  value 22uF  Voltage: 4V
CAP 85C 22uF ±20% 4V WX Series Aluminum Electrolytic; MPN: UWX0G220MCL2GB; Name: Cap Polar-22uF-4V; Tan Theta: 0.35; Leakage Current: 3; Rated Ripple Current: 19; PN: 493-2075-1-ND; Diameter: 3; URL: http://www.digikey.ca/product-detail/en/UWX0G220MCL2GB/493-2075-1-ND
footprint CAPACITOR_3MM
pins: 1, 2
1 alternate drawing of the same symbol

## Cap Polar-22uF-6.3V
designator C?, comment Cap Pol  value 22uF  Voltage: 6.3V
CAP 85C 22uF ±20% 6.3V WX Series Aluminum Electrolytic; MPN: UWX0J220MCL2GB; Name: Cap Polar-22uF-6.3V; Tan Theta: 0.26; Leakage Current: 3; Rated Ripple Current: 21; PN: 493-2083-1-ND; Diameter: 3; URL: http://www.digikey.ca/product-detail/en/UWX0J220MCL2GB/493-2083-1-ND
footprint CAPACITOR_3MM
pins: 1, 2
1 alternate drawing of the same symbol

## Cap Polar-22uF-10V
designator C?, comment Cap Pol  value 22uF  Voltage: 10V
CAP 85C 22uF ±20% 10V WX Series Aluminum Electrolytic; MPN: UWX1A220MCL1GB; Name: Cap Polar-22uF-10V; Tan Theta: 0.2; Leakage Current: 3; Rated Ripple Current: 33; PN: 493-2092-1-ND; Diameter: 5; URL: http://www.digikey.ca/product-detail/en/UWX1A220MCL1GB/493-2092-1-ND
footprint CAPACITOR_5MM
pins: 1, 2
1 alternate drawing of the same symbol

## Cap Polar-22uF-16V
designator C?, comment Cap Pol  value 22uF  Voltage: 16V
CAP 85C 22uF ±20% 16V WX Series Aluminum Electrolytic; MPN: UWX1C220MCL1GB; Name: Cap Polar-22uF-16V; Tan Theta: 0.16; Leakage Current: 3.52; Rated Ripple Current: 37; PN: 493-2101-1-ND; Diameter: 5; URL: http://www.digikey.ca/product-detail/en/UWX1C220MCL1GB/493-2101-1-ND
footprint CAPACITOR_5MM
pins: 1, 2
1 alternate drawing of the same symbol

## Cap Polar-22uF-35V
designator C?, comment Cap Pol  value 22uF  Voltage: 35V
CAP 85C 22uF ±20% 35V WX Series Aluminum Electrolytic; MPN: UWX1V220MCL1GB; Name: Cap Polar-22uF-35V; Tan Theta: 0.12; Leakage Current: 7.7; Rated Ripple Current: 46; PN: 493-2118-1-ND; Diameter: 6.3; URL: http://www.digikey.ca/product-detail/en/UWX1V220MCL1GB/493-2118-1-ND
footprint CAPACITOR_6.3MM
pins: 1, 2
1 alternate drawing of the same symbol

## Cap Polar-22uF-50V
designator C?, comment Cap Pol  value 22uF  Voltage: 50V
CAP 85C 22uF ±20% 50V WX Series Aluminum Electrolytic; MPN: UWX1H220MCL1GB; Name: Cap Polar-22uF-50V; Tan Theta: 0.12; Leakage Current: 11; Rated Ripple Current: 52; PN: 493-2136-1-ND; Diameter: 8; URL: http://www.digikey.ca/product-detail/en/UWX1H220MCL1GB/493-2136-1-ND
footprint CAPACITOR_8MM
pins: 1, 2
1 alternate drawing of the same symbol

## Cap Polar-33uF-6.3V
designator C?, comment Cap Pol  value 33uF  Voltage: 6.3V
CAP 85C 33uF ±20% 6.3V WX Series Aluminum Electrolytic; MPN: UWX0J330MCL1GB; Name: Cap Polar-33uF-6.3V; Tan Theta: 0.26; Leakage Current: 3; Rated Ripple Current: 37; PN: 493-2085-1-ND; Diameter: 5; URL: http://www.digikey.ca/product-detail/en/UWX0J330MCL1GB/493-2085-1-ND
footprint CAPACITOR_5MM
pins: 1, 2
1 alternate drawing of the same symbol

## Cap Polar-33uF-10V
designator C?, comment Cap Pol  value 33uF  Voltage: 10V
CAP 85C 33uF ±20% 10V WX Series Aluminum Electrolytic; MPN: UWX1A330MCL1GB; Name: Cap Polar-33uF-10V; Tan Theta: 0.2; Leakage Current: 3.3; Rated Ripple Current: 41; PN: 493-2093-1-ND; Diameter: 5; URL: http://www.digikey.ca/product-detail/en/UWX1A330MCL1GB/493-2093-1-ND
footprint CAPACITOR_5MM
pins: 1, 2
1 alternate drawing of the same symbol

## Cap Polar-33uF-16V
designator C?, comment Cap Pol  value 33uF  Voltage: 16V
CAP 85C 33uF ±20% 16V WX Series Aluminum Electrolytic; MPN: UWX1C330MCL1GB; Name: Cap Polar-33uF-16V; Tan Theta: 0.16; Leakage Current: 5.28; Rated Ripple Current: 49; PN: 493-2102-1-ND; Diameter: 6.3; URL: http://www.digikey.ca/product-detail/en/UWX1C330MCL1GB/493-2102-1-ND
footprint CAPACITOR_6.3MM
pins: 1, 2
1 alternate drawing of the same symbol

## Cap Polar-33uF-35V
designator C?, comment Cap Pol  value 33uF  Voltage: 35V
CAP 85C 33uF ±20% 35V WX Series Aluminum Electrolytic; MPN: UWX1V330MCL1GB; Name: Cap Polar-33uF-35V; Tan Theta: 0.12; Leakage Current: 11.55; Rated Ripple Current: 62; PN: 493-2119-1-ND; Diameter: 8; URL: http://www.digikey.ca/product-detail/en/UWX1V330MCL1GB/493-2119-1-ND
footprint CAPACITOR_8MM
pins: 1, 2
1 alternate drawing of the same symbol

## Cap Polar-33uF-50V
designator C?, comment Cap Pol  value 33uF  Voltage: 50V
CAP 85C 33uF ±20% 50V WX Series Aluminum Electrolytic; MPN: UWX1H330MCL1GB; Name: Cap Polar-33uF-50V; Tan Theta: 0.12; Leakage Current: 16.5; Rated Ripple Current: 71; PN: 493-2137-1-ND; Diameter: 8; URL: http://www.digikey.ca/product-detail/en/UWX1H330MCL1GB/493-2137-1-ND
footprint CAPACITOR_8MM
pins: 1, 2
1 alternate drawing of the same symbol

## Cap Polar-47uF-6.3V
designator C?, comment Cap Pol  value 47uF  Voltage: 6.3V
CAP 85C 47uF ±20% 6.3V WX Series Aluminum Electrolytic; MPN: UWX0J470MCL1GB; Name: Cap Polar-47uF-6.3V; Tan Theta: 0.26; Leakage Current: 3; Rated Ripple Current: 45; PN: 493-2086-1-ND; Diameter: 5; URL: http://www.digikey.ca/product-detail/en/UWX0J470MCL1GB/493-2086-1-ND
footprint CAPACITOR_5MM
pins: 1, 2
1 alternate drawing of the same symbol

## Cap Polar-47uF-10V
designator C?, comment Cap Pol  value 47uF  Voltage: 10V